# Altium footprint library myLibraryAltium.PcbLib: 215 footprints (part 11 of 14)
Each footprint in its own frame and in the unit in brackets; x right, y up, seen from the top. Pads: shape width x height; smd on the part's side, far side on the other; paste and mask are expansions set on the pad; w line width, h text height; cw(c..) or ccw(c..) is an arc to the next point about the centre after c.
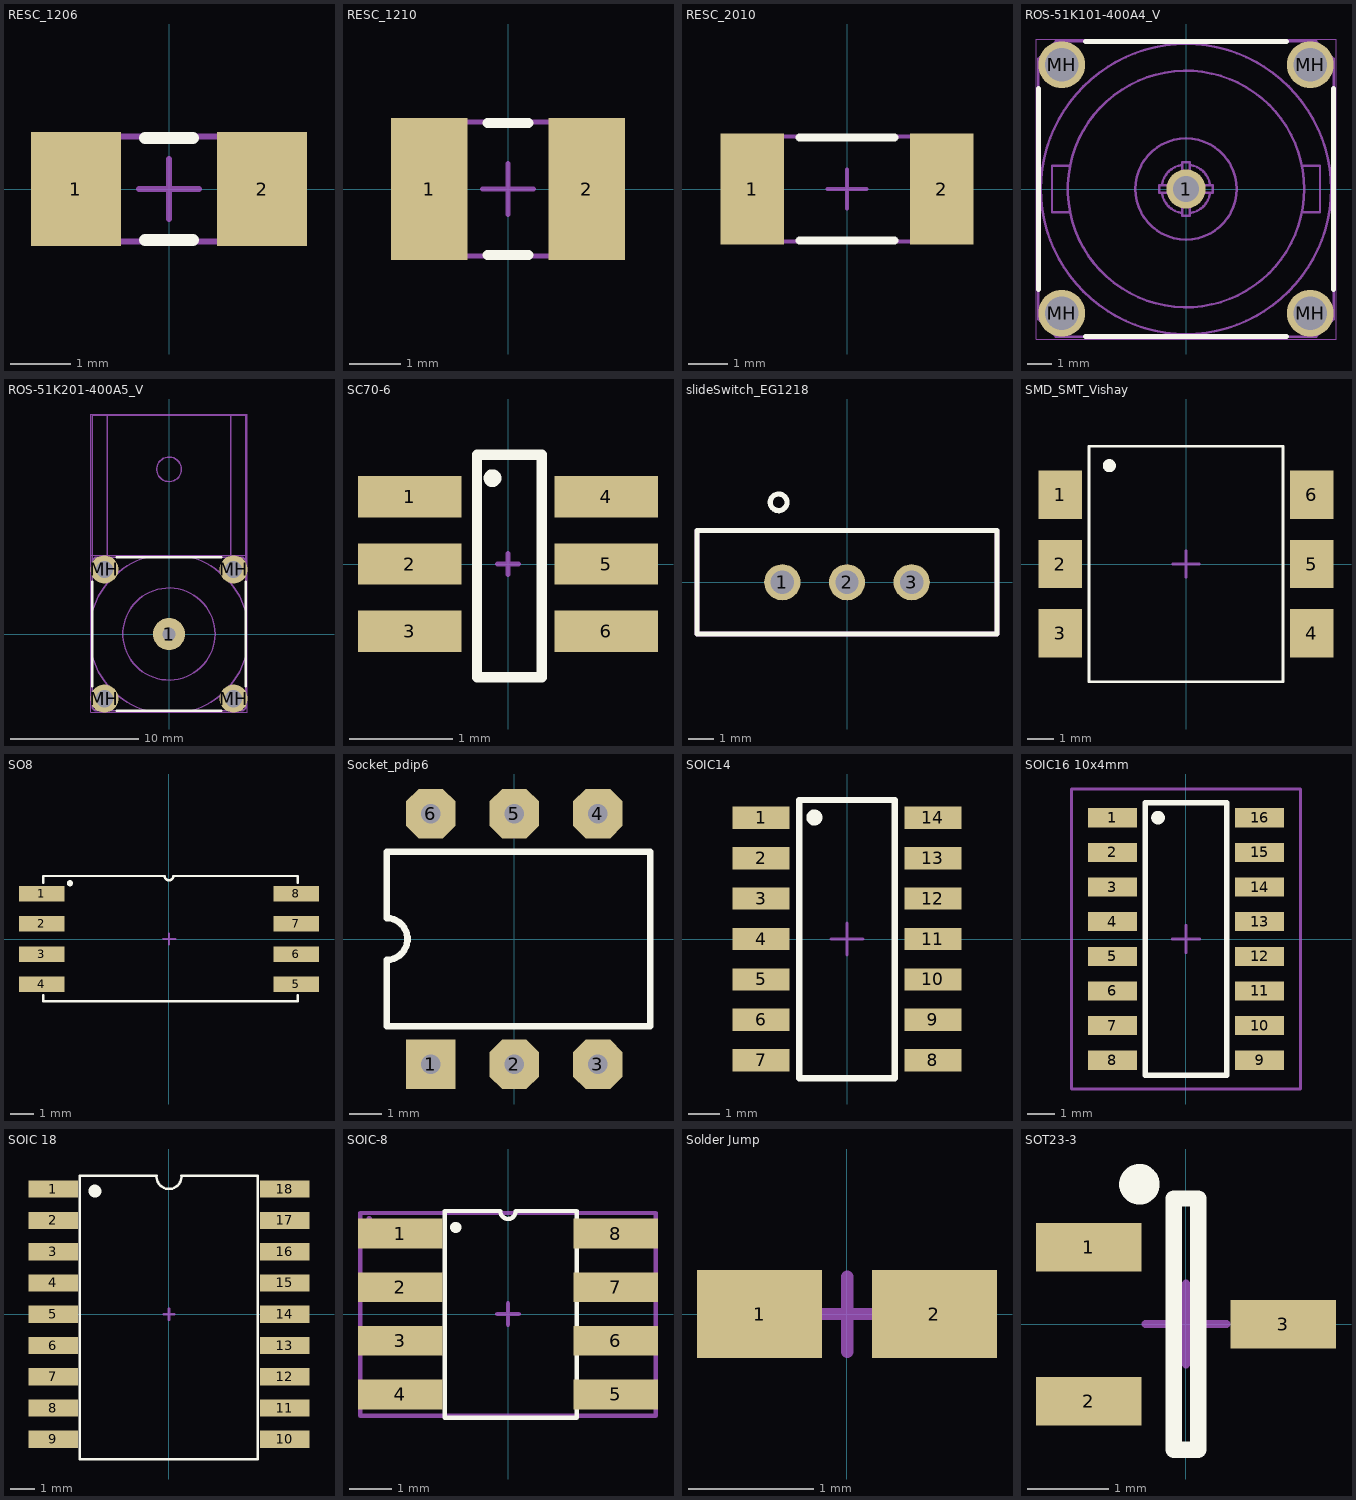
[diagram p10: the footprints below, top view; thin cyan lines are the x and y axes]

## RESC_1206 [mm] "Chip Resistor, Body 3.2x1.6mm, IPC Low Density"
height 0.71
pads (2):
  rect 1.5x1.9 smd: 1(-1.55,0) 2(1.55,0)
Top Overlay:
  lines w0.2: -0.4,-0.85 0.4,-0.85 ; -0.4,0.85 0.4,0.85
Mechanical 13:
  lines w0.1: -1.675,-0.875 -1.675,0.875 1.675,0.875 1.675,-0.875 -1.675,-0.875
Mechanical 15:
  lines w0.1: -0.5,0 0.5,0 ; 0,-0.5 0,0.5
3D body: height 0.71, standoff 0, extent -1.675,-0.875 1.675,0.875

## RESC_1210 [mm] "Chip Resistor, Body 3.2x2.5mm, IPC Low Density"
height 0.71
pads (2):
  rect 1.5x2.8 smd: 1(-1.55,0) 2(1.55,0)
Top Overlay:
  lines w0.2: -0.4,-1.3 0.4,-1.3 ; -0.4,1.3 0.4,1.3
Mechanical 13:
  lines w0.1: -1.675,-1.32 -1.675,1.32 1.675,1.32 1.675,-1.32 -1.675,-1.32
Mechanical 15:
  lines w0.1: -0.5,0 0.5,0 ; 0,-0.5 0,0.5
3D body: height 0.71, standoff 0, extent -1.675,-1.32 1.675,1.32

## RESC_2010 [mm] "Chip Resistor, Body 5.0x2.5mm, IPC Low Density"
height 0.71
pads (2):
  rect 1.6x2.8 smd: 1(-2.4,0) 2(2.4,0)
Top Overlay:
  lines w0.2: -1.2,-1.3 1.2,-1.3 ; -1.2,1.3 1.2,1.3
Mechanical 13:
  lines w0.1: -2.575,-1.325 -2.575,1.325 2.575,1.325 2.575,-1.325 -2.575,-1.325
Mechanical 15:
  lines w0.1: -0.5,0 0.5,0 ; 0,-0.5 0,0.5
3D body: height 0.71, standoff 0, extent -2.575,-1.325 2.575,1.325

## ROS-51K101-400A4_V [mm] "BNC 50R Straight Jack, 12x12x15mm, Rosenberger Recommended"
pads (5):
  round 1.6 hole 1.05: 1(0,0)
  round 1.9 hole 1.35: MH(-5.05,-5.05) MH(-5.05,5.05) MH(5.05,-5.05) MH(5.05,5.05)
Top Overlay:
  lines w0.2: -6,-4.09 -6,4.09 ; -4.09,-6 4.09,-6 ; -4.09,6 4.09,6 ; 6,-4.09 6,4.09
Mechanical 13:
  circle w0.1: c5.05,-5.05 r0.3
  circle w0.1: c-5.05,-5.05 r0.3
  circle w0.1: c-5.05,5.05 r0.3
  circle w0.1: c5.05,5.05 r0.3
  circle w0.1: c0,0 r0.45
  circle w0.1: c-5.05,5.05 r0.6
  circle w0.1: c-5.05,-5.05 r0.6
  circle w0.1: c5.05,-5.05 r0.6
  circle w0.1: c5.05,5.05 r0.6
  circle w0.1: c0,0 r4.81
  circle w0.1: c0,0 r2.06
  circle w0.1: c0,0 r5.9
  lines w0.1: -4.699,-0.95 -5.45,-0.95 -5.45,0.952 -4.699,0.952 ; -0.989,-0.148 ccw(c0,0) -0.148,-0.989 ; -0.989,0.148 cw(c0,0) -0.148,0.989 ; -0.685,-0.147 ccw(c0,0) -0.15,-0.684 ; -0.684,0.15 cw(c0,0) -0.147,0.685 ; -0.684,-0.15 -1.09,-0.15 -1.09,0.15 -0.684,0.15 ; -0.15,-0.684 -0.15,-1.09 0.15,-1.09 0.15,-0.684 ; -0.15,0.684 -0.15,1.09 0.15,1.09 0.15,0.684 ; 0.147,-0.685 ccw(c0,0) 0.684,-0.15 ; 0.148,-0.989 ccw(c0,0) 0.989,-0.148 ; 0.148,0.989 cw(c0,0) 0.989,0.148 ; 0.15,0.684 cw(c0,0) 0.685,0.147 ; 0.684,-0.15 1.09,-0.15 1.09,0.15 0.684,0.15 ; 4.699,-0.95 5.45,-0.95 5.45,0.952 4.699,0.952 ; -6,-5.294 -5.294,-6 5.294,-6 6,-5.294 6,5.294 5.294,6 -5.294,6 -6,5.294 -6,-5.294
Mechanical 15:
  lines w0.05: -6.1,-6.1 6.1,-6.1 6.1,6.1 -6.1,6.1 -6.1,-6.1
  lines w0.1: -0.5,0 0.5,0 ; 0,-0.5 0,0.5
3D body "51k101-400a4.stp": height 15, standoff -3.97, extent -6,-6 6,6

## ROS-51K201-400A5_V [mm] "BNC 50R Right Angle Jack, 12x23.1x14.5mm, Rosenberger Recommended"
pads (5):
  round 2.5 hole 1.05: 1(0,0)
  round 2.2 hole 1.35: MH(-5.05,-5.05) MH(-5.05,5.05) MH(5.05,-5.05) MH(5.05,5.05)
Top Overlay:
  lines w0.2: -6,-4.091 -6,4.091 ; -4.091,-6 4.091,-6 ; -4.091,6 4.091,6 ; 6,-4.091 6,4.091
Mechanical 13:
  circle w0.1: c0,0 r0.45
  circle w0.1: c0,0 r3.6
  circle w0.1: c5.05,-5.05 r0.6
  circle w0.1: c-5.05,-5.05 r0.6
  circle w0.1: c-5.05,5.05 r0.6
  circle w0.1: c5.05,5.05 r0.6
  circle w0.1: c0,12.875 r0.955
  lines w0.1: -6,5.662 cw(c-5.662,5.662) -5.662,6 5.662,6 cw(c5.662,5.662) 6,5.662 ; -5.99,-1.784 ccw(c0,0) -1.75,-6 ; -5.99,1.784 cw(c0,0) -1.75,6 ; -4.826,6 -4.826,17.1 -4.826,6.35 ; 1.75,-6 ccw(c0,0) 5.99,-1.784 ; 1.75,6 cw(c0,0) 5.99,1.784 ; 4.81,6 4.81,17.1 4.81,6.35 ; 5.662,-6 ccw(c5.662,-5.662) 6,-5.662 ; 5.715,-6 -5.662,-6 cw(c-5.662,-5.662) -6,-5.662 -6,17.1 6,17.1 6,-5.715
Mechanical 15:
  lines w0.05: -6.1,6.15 6.1,6.15 ; -6.1,-6.1 6.1,-6.1 6.1,17.2 -6.1,17.2 -6.1,-6.1
  lines w0.1: -0.5,0 0.5,0 ; 0,-0.5 0,0.5
3D body "51k201-400a5.stp": height 14.5, standoff -4, extent -6,-6 6,17.1

## SC70-6 [mm]
height 1.73
pads (6):
  rect 1x0.4 smd: 1(-0.95,0.65) 2(-0.95,0) 3(-0.95,-0.65) 4(0.95,0.65) 5(0.95,0) 6(0.95,-0.65)
Top Overlay:
  circle w0.1: c-0.15,0.83 r0.035
  lines w0.1: -0.3,-1.095 -0.3,1.055 0.325,1.055 0.325,-1.095 -0.3,-1.095
Mechanical 15:
  lines w0.05: -0.1,0 0.1,0 ; 0,-0.1 0,0.1
3D body "User Library-SC70-6.step": height 0.92, standoff -0.03, extent -1.05,-1 1.05,1

## slideSwitch_EG1218 [mm]
pads (3):
  round 1.4 hole 0.9: 1(-2.5,0) 2(0,0) 3(2.5,0)
Top Overlay:
  circle w0.2: c-2.643,3.091 r0.323
  lines w0.2: -5.8,-2 5.8,-2 5.8,2 -5.8,2 -5.8,-2
Mechanical 15:
  lines w0.2: -5.8,-2 5.8,-2 5.8,2 -5.8,2 -5.8,-2

## SMD_SMT_Vishay [mm] "6-Leads, Option 9"
height 1
pads (6):
  rect 1.65x1.85 smd: 1(-4.8,2.64) 2(-4.8,0) 3(-4.8,-2.64) 4(4.8,-2.64) 5(4.8,0) 6(4.8,2.65)
Top Overlay:
  circle w0.25: c-2.926,3.753 r0.125
  lines w0.102: -3.7,4.5 3.7,4.5 3.7,-4.5 -3.7,-4.5 -3.7,4.5
Mechanical 15:
  lines w0.1: -0.5,0 0.5,0 ; 0,-0.5 0,0.5
3D body "User Library-FAIRCHILD N06C_SMDIP-6.step": height 5.08, standoff 0, extent -4.95,-4.369 4.95,4.521

## SO8 [mm] "Source: Pads"
pads (8):
  rect 1.91x0.65 smd mask+0.05: 1(-5.37,1.905) 2(-5.37,0.635) 3(-5.37,-0.635) 4(-5.37,-1.905) 5(5.37,-1.905) 6(5.37,-0.635) 7(5.37,0.635) 8(5.37,1.905)
Top Overlay:
  lines w0.102: -5.3,2.38 -5.3,2.655 -0.18,2.655 ccw(c0,2.655) 0.18,2.655 5.4,2.655 ; -5.298,-2.366 -5.298,-2.62 5.425,-2.62 5.425,-2.366 ; 5.425,2.38 5.425,2.655
  lines w0.254: -4.175,2.355 ccw(c-4.175,2.35) -4.17,2.35
Mechanical 3:
  lines w0.102: -0.252,0 0.256,0 ; 0,-0.225 0,0.225
3D body "User Library-SSO-8.step": height 3.39, standoff 0.01, extent -5.85,-2.975 5.65,2.875

## Socket_pdip6 [mm] "DIP; 8 Leads; Row Spacing 7.62 mm; Pitch 2.54 mm"
height 5.08
pads (6):
  rect 1.5x1.5 hole 0.6: 1(-2.54,-3.81)
  oct 1.5x1.5 hole 0.6: 2(0,-3.81) 3(2.54,-3.81) 4(2.54,3.81) 5(0,3.81) 6(-2.54,3.81)
Top Overlay:
  lines w0.2: -3.88,-2.65 -3.88,-0.635 ccw(c-3.88,0) -3.88,0.635 -3.88,2.65 4.133,2.65 4.133,-2.65 -3.88,-2.65
3D body "87x6756_1-2199298-1.stp": height 5.1, standoff -3, extent -3.814,-5.004 3.806,4.996

## SOIC14 [mm] "SOIC, 14"
height 1.73
pads (14):
  rect 1.8x0.7 smd: 1(-2.7,3.81) 2(-2.7,2.54) 3(-2.7,1.27) 4(-2.7,0) 5(-2.7,-1.27) 6(-2.7,-2.54) 7(-2.7,-3.81) 8(2.7,-3.81) 9(2.7,-2.54) 10(2.7,-1.27) 11(2.7,0) 12(2.7,1.27) 13(2.7,2.54) 14(2.7,3.81)
Top Overlay:
  circle w0.25: c-1.025,3.815 r0.125
  lines w0.2: -1.5,-4.375 -1.5,4.365 1.5,4.365 1.5,-4.375 -1.5,-4.375
Mechanical 15:
  lines w0.1: -0.5,0 0.5,0 ; 0,-0.5 0,0.5
3D body "User Library-SOIC-14.STEP": height 1.75, standoff 0, extent -2.9,-4.375 3.1,4.375

## SOIC16 10x4mm [mm] "SOIC, 16-Leads, Body 9.9x3.9mm, Pitch 1.27mm, IPC Low Density"
height 1.73
pads (16):
  rect 1.8x0.7 smd: 1(-2.7,4.445) 2(-2.7,3.175) 3(-2.7,1.905) 4(-2.7,0.635) 5(-2.7,-0.635) 6(-2.7,-1.905) 7(-2.7,-3.175) 8(-2.7,-4.445) 9(2.7,-4.445) 10(2.7,-3.175) 11(2.7,-1.905) 12(2.7,-0.635) 13(2.7,0.635) 14(2.7,1.905) 15(2.7,3.175) 16(2.7,4.445)
Top Overlay:
  circle w0.25: c-1.025,4.45 r0.125
  lines w0.2: -1.5,-5 1.5,-5 1.5,5 -1.5,5 -1.5,-5
Mechanical 15:
  lines w0.1: -0.5,0 0.5,0 ; 0,-0.5 0,0.5 ; -4.2,-5.5 4.2,-5.5 4.2,5.5 -4.2,5.5 -4.2,-5.5
3D body "User Library-SOIC-16-1.STEP": height 1.4, standoff 0, extent -3.025,-4.922 2.975,4.978

## SOIC 18 [mm] "Source: Pads"
pads (18):
  rect 2x0.7 smd mask+0: 1(-4.7,5.08) 2(-4.7,3.81) 3(-4.7,2.54) 4(-4.7,1.27) 5(-4.7,0) 6(-4.7,-1.27) 7(-4.7,-2.54) 8(-4.7,-3.81) 9(-4.7,-5.08) 10(4.7,-5.08) 11(4.7,-3.81) 12(4.7,-2.54) 13(4.7,-1.27) 14(4.7,0) 15(4.7,1.27) 16(4.7,2.54) 17(4.7,3.81) 18(4.7,5.08)
Top Overlay:
  lines w0.102: -0.508,5.591 ccw(c0,5.591) 0.508,5.591 ; -0.5,5.614 -3.618,5.614 -3.618,-5.887 3.593,-5.887 3.593,5.614 0.5,5.614
  lines w0.508: -3.005,5.005 ccw(c-3.005,5) -3,5
Mechanical 3:
  lines w0.102: -0.222,0 0.222,0 ; 0,-0.222 0,0.222
3D body "User Library-PIC16F819-I-SOIC18.step": height 2.31, standoff -0.2, extent -5.24,-5.765 5.1,5.765

## SOIC-8 [mm] "Source: Pads"
pads (8):
  rect 2x0.7 smd mask+0: 1(-2.55,1.905) 2(-2.55,0.635) 3(-2.55,-0.635) 4(-2.55,-1.905) 5(2.55,-1.905) 6(2.55,-0.635) 7(2.55,0.635) 8(2.55,1.905)
Top Overlay:
  lines w0.102: -0.18,2.43 ccw(c0,2.43) 0.18,2.439 1.625,2.439 1.625,-2.456 -1.5,-2.456 -1.5,2.439 -0.18,2.439
  lines w0.254: -1.235,2.055 ccw(c-1.235,2.05) -1.23,2.05
Mechanical 3:
  lines w0.102: -0.254,0 0.254,0 ; 0,-0.254 0,0.254
Mechanical 5:
  lines w0.102: -3.5,-2.41 -3.5,2.39 3.5,2.39 3.5,-2.41 -3.5,-2.41
  lines w0.127: -3.285,2.255 ccw(c-3.285,2.25) -3.28,2.25
3D body "User Library-so8-3.STEP": height 1.7, standoff 0, extent -2.95,-2.457 3.05,2.443

## Solder Jump [mm]
pads (2):
  rect 1x0.7 smd: 1(-0.7,0) 2(0.7,0)
Mechanical 15:
  lines w0.1: -0.3,0 0.3,0 ; 0,-0.3 0,0.3

## SOT23-3 [mm] "SOT23, 3"
height 1.45
pads (3):
  rect 1.3x0.6 smd mask+0.05: 1(-1.2,0.95) 2(-1.2,-0.95) 3(1.2,0)
Top Overlay:
  circle w0.25: c-0.575,1.725 r0.125
  lines w0.2: -0.15,-1.55 -0.15,1.55 0.15,1.55 0.15,-1.55 -0.15,-1.55
Mechanical 15:
  lines w0.1: -0.5,0 0.5,0 ; 0,-0.5 0,0.5
3D body "User Library-3-lead sot23-3.step": height 1, standoff -0.02, extent -1.325,-1.46 1.151,1.46